# Altium footprint library 16-PCBa Modl.PcbLib: 81 footprints (part 1 of 6)
Each footprint in its own frame and in the unit in brackets; x right, y up, seen from the top. Pads: shape width x height; smd on the part's side, far side on the other; paste and mask are expansions set on the pad; w line width, h text height; cw(c..) or ccw(c..) is an arc to the next point about the centre after c.
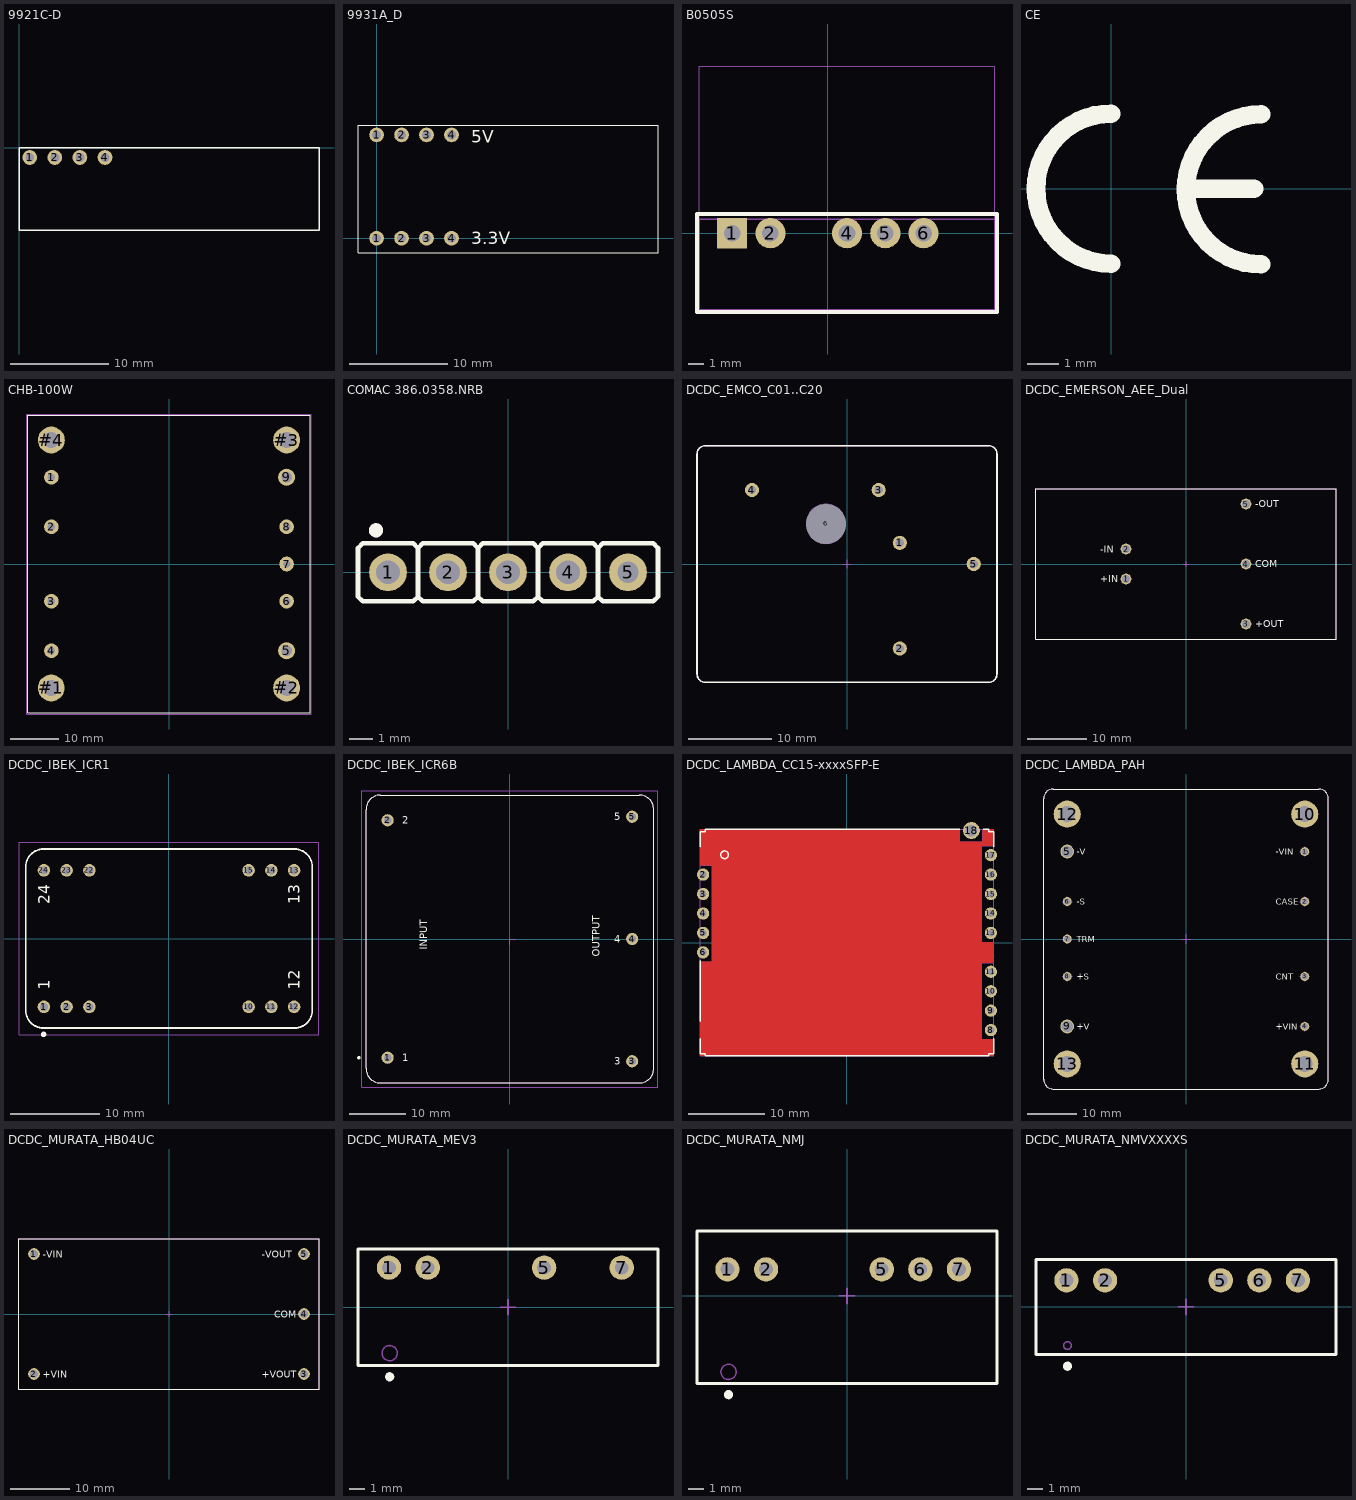
[diagram p0: the footprints below, top view; thin cyan lines are the x and y axes]

## 9921C-D [mm]
height 4.8
pads (4):
  round 1.5 hole 0.9: 1(1.09,-1) 2(3.63,-1) 3(6.17,-1) 4(8.71,-1)
Top Overlay:
  lines w0.127: 0,-8.4 30.4,-8.4 30.4,0 0,0 0,-8.4
3D body "9921C.step": height 6, standoff -2.5, extent 0.127,-8.282 30.226,0.1

## 9931A_D [mm]
height 4.8
pads (8):
  round 1.5 hole 0.9: 1(0,0) 1(0,10.5) 2(2.54,0) 2(2.54,10.5) 3(5.08,0) 3(5.08,10.5) 4(7.62,0) 4(7.62,10.5)
Top Overlay:
  lines w0.127: -1.89,-1.5 28.61,-1.5 28.61,11.5 -1.89,11.5 -1.89,-1.5
  text "3.3V" at 9.61,-0.6 h1.27
  text "5V" at 9.61,9.7 h1.27
3D body "9931A.step": height 6, standoff -3, extent -1.923,-1.6 28.176,11.735

## B0505S [mm]
height 4.8
pads (5):
  rect 2x2 hole 1.1: 1(-6.35,0)
  round 2 hole 1.1 mask+0.07: 2(-3.81,0) 4(1.27,0) 5(3.81,0) 6(6.35,0)
Top Overlay:
  lines w0.254: -8.674,-5.22 11.214,-5.22 11.214,1.27 -8.674,1.27 -8.674,-5.22
Mechanical 15:
  lines w0.05: -8.53,0.92 -8.53,11.08 11.07,11.08 11.07,0.92
  lines w0.1: -8.53,-5.08 11.07,-5.08 11.07,0.92 -8.53,0.92 -8.53,-5.08
3D body "b0505s.stp": height 10.2, standoff -2.49, extent -8.53,-4.859 11.07,1.171

## CE [mm]
Top Overlay:
  lines w0.6: 0,-2.413 cw(c0,0) 0,2.413 ; 2.53,0 4.6,0 ; 4.826,-2.438 cw(c4.826,-0.025) 4.826,2.388
3D body "ce.stp": height 0.02, standoff 0, extent -2.725,-2.725 4.82,2.725

## CHB-100W [mm]
height 4.8
pads (13):
  round 3 hole 1.5: 1(-24.1,17.78) 2(-24.1,7.62) 3(-24.1,-7.62) 4(-24.1,-17.78) 6(24.1,-7.62) 7(24.1,0) 8(24.1,7.62)
  round 3.5 hole 2.2: 5(24.1,-17.78) 9(24.1,17.78)
  round 5.5 hole 3.2: #1(-24.121,-25.4) #2(24.1,-25.4) #3(24.1,25.4) #4(-24.1,25.4)
Top Overlay:
  lines w0.2: -28.95,-30.5 28.95,-30.5 28.95,30.5 -28.95,30.5 -28.95,-30.5
Mechanical 11:
  circle w0.1: c-24.121,-25.4 r1.6
  circle w0.1: c-24.1,25.4 r1.6
  circle w0.1: c24.1,25.4 r1.6
  circle w0.1: c24.1,-25.4 r1.6
  lines w0.254: -29.185,-30.734 29.185,-30.734 29.185,30.734 -29.185,30.734 -29.185,-30.734
3D body "chb100w.stp": height 12.7, standoff -4.6, extent -28.95,-30.5 28.95,30.52
3D body "3-3-1_2-1_8.stp": height 0, standoff -1.8, extent 22.6,6.122 25.6,9.119
3D body "3-3-1_2-1_8.stp": height 0, standoff -1.8, extent 22.6,-1.498 25.6,1.499
3D body "3-3-1_2-1_8.stp": height 0, standoff -1.8, extent 22.6,-9.118 25.6,-6.121
3D body "3-3-1_2-1_8.stp": height 0, standoff -1.8, extent -25.6,-19.278 -22.6,-16.281
3D body "3-3-1_2-1_8.stp": height 0, standoff -1.8, extent -25.6,-9.118 -22.6,-6.121
3D body "3-3-1_2-1_8.stp": height 0, standoff -1.8, extent -25.6,6.122 -22.6,9.119
3D body "3-3-1_2-1_8.stp": height 0, standoff -1.8, extent -25.6,16.282 -22.6,19.279
3D body "3_5-3_5-2-1_8.stp": height 0, standoff -1.8, extent 22.35,-19.528 25.85,-16.032
3D body "3_5-3_5-2-1_8.stp": height 0, standoff -1.8, extent 22.35,16.032 25.85,19.528
3D body "5_5-5_5-3-1_8.stp": height 0, standoff -1.8, extent -26.85,22.653 -21.35,28.147
3D body "5_5-5_5-3-1_8.stp": height 0, standoff -1.8, extent -26.871,-28.147 -21.371,-22.653
3D body "5_5-5_5-3-1_8.stp": height 0, standoff -1.8, extent 21.35,-28.147 26.85,-22.653
3D body "5_5-5_5-3-1_8.stp": height 0, standoff -1.8, extent 21.35,22.653 26.85,28.147

## COMAC 386.0358.NRB [mm]
height 8.3
pads (5):
  round 1.6 hole 1: 1(-5.08,0) 2(-2.54,0) 3(0,0) 4(2.54,0)
  round 1.6 hole 0.9: 5(5.08,0)
Top Overlay:
  circle w0.3: c-5.588,1.778 r0.15
  lines w0.2: -3.81,-1.025 -3.61,-1.225 -1.47,-1.225 -1.27,-1.025 ; -3.81,-1.025 -3.81,1.025 ; -3.81,-1.025 -4.01,-1.225 -6.15,-1.225 -6.35,-1.025 -6.35,1.025 -6.15,1.225 -4.01,1.225 -3.81,1.025 ; -3.81,1.025 -3.61,1.225 -1.47,1.225 -1.27,1.025 ; -1.27,-1.025 -1.07,-1.225 1.07,-1.225 1.27,-1.025 ; -1.27,-1.025 -1.27,1.025 ; -1.27,1.025 -1.07,1.225 1.07,1.225 1.27,1.025 ; 1.27,-1.025 1.47,-1.225 3.61,-1.225 3.81,-1.025 ; 1.27,-1.025 1.27,1.025 ; 1.27,1.025 1.47,1.225 3.61,1.225 3.81,1.025 ; 3.81,-1.025 3.81,1.025 ; 3.81,-1.025 4.01,-1.225 6.15,-1.225 6.35,-1.025 6.35,1.025 6.15,1.225 4.01,1.225 3.81,1.025
Mechanical 14:
  circle w0.3: c-5.588,1.778 r0.15
  lines w0.1: -3.81,-1.025 -3.61,-1.225 -1.47,-1.225 -1.27,-1.025 ; -3.81,-1.025 -3.81,1.025 ; -3.81,-1.025 -4.01,-1.225 -6.15,-1.225 -6.35,-1.025 -6.35,1.025 -6.15,1.225 -4.01,1.225 -3.81,1.025 ; -3.81,1.025 -3.61,1.225 -1.47,1.225 -1.27,1.025 ; -1.27,-1.025 -1.07,-1.225 1.07,-1.225 1.27,-1.025 ; -1.27,-1.025 -1.27,1.025 ; -1.27,1.025 -1.07,1.225 1.07,1.225 1.27,1.025 ; 1.27,-1.025 1.27,1.025 ; 1.27,-1.025 1.47,-1.225 3.61,-1.225 3.81,-1.025 ; 1.27,1.025 1.47,1.225 3.61,1.225 3.81,1.025 ; 3.81,-1.025 3.81,1.025 ; 3.81,-1.025 4.01,-1.225 6.15,-1.225 6.35,-1.025 6.35,1.025 6.15,1.225 4.01,1.225 3.81,1.025
3D body "SAS-Test-301B.step": height 20.05, standoff -2.13, extent -12.677,-0.381 12.423,6.889

## DCDC_EMCO_C01..C20 [mm] "C Series , Body 35.56 x 27.94mm, High Voltage DC-DC Converter"
height 13.21
pads (6):
  round 1.7 hole 1: 1(6.35,2.54) 2(6.35,-10.16) 3(3.81,8.89) 4(-11.43,8.89) 5(15.24,0)
  round 1 hole 4.8 unplated mask+1.9: 6(-2.54,4.83)
Top Overlay:
  lines w0.2: -18.035,-13.225 ccw(c-17.035,-13.225) -17.035,-14.225 17.035,-14.225 ccw(c17.035,-13.225) 18.035,-13.225 18.035,13.225 ccw(c17.035,13.225) 17.035,14.225 -17.035,14.225 ccw(c-17.035,13.225) -18.035,13.225 -18.035,-13.225
Mechanical 8:
  circle w0.1: c-2.54,4.83 r2.375
  lines w0.1: -11.93,8.89 -11.43,8.89 ; -11.43,8.39 -11.43,8.89 ; -11.43,9.39 -11.43,8.89 ; -10.93,8.89 -11.43,8.89 ; -3.04,4.83 -2.54,4.83 ; -2.54,4.33 -2.54,4.83 ; -2.54,5.33 -2.54,4.83 ; -2.04,4.83 -2.54,4.83 ; -0.5,0 0,0 ; 0,-0.5 0,0 ; 0,0.5 0,0 ; 0.5,0 0,0 ; 3.31,8.89 3.81,8.89 ; 3.81,8.39 3.81,8.89 ; 3.81,9.39 3.81,8.89 ; 4.31,8.89 3.81,8.89 ; 5.85,-10.16 6.35,-10.16 ; 5.85,2.54 6.35,2.54 ; 6.35,-10.66 6.35,-10.16 ; 6.35,-9.66 6.35,-10.16 ; 6.35,2.04 6.35,2.54 ; 6.35,3.04 6.35,2.54 ; 6.85,-10.16 6.35,-10.16 ; 6.85,2.54 6.35,2.54 ; 14.74,0 15.24,0 ; 15.24,-0.5 15.24,0 ; 15.24,0.5 15.24,0 ; 15.74,0 15.24,0
Mechanical 14:
  lines w0.1: -18.035,-13.225 ccw(c-17.035,-13.225) -17.035,-14.225 17.035,-14.225 ccw(c17.035,-13.225) 18.035,-13.225 18.035,13.225 ccw(c17.035,13.225) 17.035,14.225 -17.035,14.225 ccw(c-17.035,13.225) -18.035,13.225 -18.035,-13.225
3D body "DCDC_EMCO_C.stp": height 13.21, standoff -3.8, extent -18.035,-14.225 18.035,14.225

## DCDC_EMERSON_AEE_Dual [mm] "AEE 15W Series , Dual Output DCDC Converter, Body 50.8x25.4mm, Height 11.3mm"
height 11.3
pads (5):
  round 1.8 hole 1.3: 1(-10.16,-2.54) 2(-10.16,2.54) 3(10.16,-10.16) 4(10.16,0) 5(10.16,10.16)
Top Overlay:
  lines w0.2: -25.4,-12.7 25.4,-12.7 25.4,12.7 -25.4,12.7 -25.4,-12.7
  text "COM" at 11.71,-0.515 h1.2
  text "+IN" at -14.55,-3.1 h1.2
  text "+OUT" at 11.71,-10.675 h1.2
  text "-OUT" at 11.71,9.645 h1.2
  text "-IN" at -14.55,1.9 h1.2
Mechanical 8:
  lines w0.1: -10.66,-2.54 -10.16,-2.54 ; -10.66,2.54 -10.16,2.54 ; -10.16,-3.04 -10.16,-2.54 ; -10.16,-2.04 -10.16,-2.54 ; -10.16,2.04 -10.16,2.54 ; -10.16,3.04 -10.16,2.54 ; -9.66,-2.54 -10.16,-2.54 ; -9.66,2.54 -10.16,2.54 ; -0.5,0 0,0 ; 0,-0.5 0,0 ; 0,0.5 0,0 ; 0.5,0 0,0 ; 9.66,-10.16 10.16,-10.16 ; 9.66,0 10.16,0 ; 9.66,10.16 10.16,10.16 ; 10.16,-10.66 10.16,-10.16 ; 10.16,-9.66 10.16,-10.16 ; 10.16,-0.5 10.16,0 ; 10.16,0.5 10.16,0 ; 10.16,9.66 10.16,10.16 ; 10.16,10.66 10.16,10.16 ; 10.66,-10.16 10.16,-10.16 ; 10.66,0 10.16,0 ; 10.66,10.16 10.16,10.16
Mechanical 14:
  lines w0.1: -25.4,-12.7 25.4,-12.7 25.4,12.7 -25.4,12.7 -25.4,-12.7
  text "COM" at 11.71,-0.515 h1.2
  text "-IN" at -14.55,1.9 h1.2
  text "+IN" at -14.55,-3.1 h1.2
  text "-OUT" at 11.71,9.645 h1.2
  text "+OUT" at 11.71,-10.675 h1.2
3D body "DCDC_EMERSON_AEE_Dual.stp": height 11.3, standoff -3.8, extent -25.4,-12.7 25.4,12.7

## DCDC_IBEK_ICR1 [mm] "ICR1 Series , Body 32x20mm, Pitch 2.54mm"
height 10.5
pads (12):
  round 1.4 hole 0.9: 1(-13.97,-7.62) 2(-11.43,-7.62) 3(-8.89,-7.62) 10(8.89,-7.62) 11(11.43,-7.62) 12(13.97,-7.62) 13(13.97,7.62) 14(11.43,7.62) 15(8.89,7.62) 22(-8.89,7.62) 23(-11.43,7.62) 24(-13.97,7.62)
Top Overlay:
  circle w0.3: c-14,-10.7 r0.15
  lines w0.2: -16,-8 ccw(c-14,-8) -14,-10 14,-10 ccw(c14,-8) 16,-8 16,8 ccw(c14,8) 14,10 -14,10 ccw(c-14,8) -16,8 -16,-8
  text "12" at 14.605,-5.715 h1.27
  text "24" at -13.335,3.81 h1.27
  text "13" at 14.605,3.81 h1.27
  text "1" at -13.335,-5.715 h1.27
Mechanical 14:
  lines w0.1: -16,-8 ccw(c-14,-8) -14,-10 14,-10 ccw(c14,-8) 16,-8 16,8 ccw(c14,8) 14,10 -14,10 ccw(c-14,8) -16,8 -16,-8
  text "24" at -13.335,3.81 h1.27
  text "13" at 14.605,3.81 h1.27
  text "12" at 14.605,-5.715 h1.27
  text "1" at -13.335,-5.715 h1.27
Mechanical 15:
  lines w0.05: -16.75,-10.75 -16.75,10.75 16.75,10.75 16.75,-10.75 -16.75,-10.75
3D body "DCDC_IBEK_ICR1.stp": height 10.5, standoff -3, extent -16,-10 16,10

## DCDC_IBEK_ICR6B [mm] "ICR6 Series , Body 50.8x50.8mm"
height 10.5
pads (5):
  round 2.15 hole 1.3: 1(-21.59,-20.955) 2(-21.59,20.955) 3(21.59,-21.59) 4(21.59,0) 5(21.59,21.59)
Top Overlay:
  circle w0.3: c-26.67,-20.955 r0.15
  lines w0.2: -25.4,-22.86 ccw(c-22.86,-22.86) -22.86,-25.4 22.86,-25.4 ccw(c22.86,-22.86) 25.4,-22.86 25.4,22.86 ccw(c22.86,22.86) 22.86,25.4 -22.86,25.4 ccw(c-22.86,22.86) -25.4,22.86 -25.4,-22.86
  text "3" at 18.415,-22.225 h1.27
  text "4" at 18.415,-0.635 h1.27
  text "5" at 18.415,20.955 h1.27
  text "2" at -19.05,20.32 h1.27
  text "1" at -19.05,-21.59 h1.27
  text "INPUT" at -14.605,-1.905 h1.27
  text "OUTPUT" at 15.875,-3.175 h1.27
Mechanical 8:
  circle w0.1: c-21.59,-20.955 r0.5
  circle w0.1: c21.59,-21.59 r0.5
  circle w0.1: c21.59,0 r0.5
  circle w0.1: c21.59,21.59 r0.5
  circle w0.1: c-21.59,20.955 r0.5
  lines w0.2: -21.59,-21.955 -21.59,-20.955 -20.59,-20.955 ; -21.59,19.955 -21.59,20.955 -20.59,20.955 ; 0,-1 0,0 1,0 ; 21.59,-22.59 21.59,-21.59 22.59,-21.59 ; 21.59,-1 21.59,0 22.59,0 ; 21.59,20.59 21.59,21.59 22.59,21.59
Mechanical 14:
  lines w0.1: -25.4,-22.86 ccw(c-22.86,-22.86) -22.86,-25.4 22.86,-25.4 ccw(c22.86,-22.86) 25.4,-22.86 25.4,22.86 ccw(c22.86,22.86) 22.86,25.4 -22.86,25.4 ccw(c-22.86,22.86) -25.4,22.86 -25.4,-22.86
  text "3" at 18.415,-22.225 h1.27
  text "4" at 18.415,-0.635 h1.27
  text "5" at 18.415,20.955 h1.27
  text "2" at -19.05,20.32 h1.27
  text "1" at -19.05,-21.59 h1.27
  text "INPUT" at -14.605,-1.905 h1.27
  text "OUTPUT" at 15.875,-3.175 h1.27
Mechanical 15:
  lines w0.05: -26.15,-26.15 -26.15,26.15 26.15,26.15 26.15,-26.15 -26.15,-26.15
3D body "DCDC_IBEK_ICR6B.stp": height 10.5, standoff -3, extent -25.4,-25.4 25.4,25.4

## DCDC_LAMBDA_CC15-xxxxSFP-E [mm] "CCP-E Series, Body L 38.4mm x W 29.6mm x H 6.8mm"
height 6.8
pads (15):
  round 1.6 hole 0.9: 2(-18.8,8.89) 3(-18.8,6.35) 4(-18.8,3.81) 5(-18.8,1.27) 6(-18.8,-1.27) 8(18.8,-11.43) 9(18.8,-8.89) 10(18.8,-6.35) 11(18.8,-3.81) 13(18.8,1.27) 14(18.8,3.81) 15(18.8,6.35) 16(18.8,8.89) 17(18.8,11.43)
  round 2.2 hole 1.5: 18(16.26,14.65)
Top Layer:
  region: -19.2,-2.47 -17.6,-2.47 -17.6,10.09 -19.2,10.09 -19.2,14.8 14.76,14.8 14.76,13.15 17.76,13.15 17.76,14.8 19.2,14.8 19.2,12.63 17.6,12.63 17.6,0.07 19.2,0.07 19.2,-2.61 17.6,-2.61 17.6,-12.63 19.2,-12.63 19.2,-14.8 -19.2,-14.8
Top Overlay:
  circle w0.2: c-16,11.48 r0.5
  lines w0.2: -19.2,-12.561 -19.2,-14.5 -18.5,-14.5 -18.5,-14.8 18.5,-14.8 18.5,-14.5 19.2,-14.5 19.2,-12.561 ; -19.2,-10.299 -19.2,-2.401 ; -19.2,12.561 -19.2,14.5 -18.5,14.5 -18.5,14.8 14.732,14.8 ; 17.78,14.8 18.5,14.8 18.5,14.5 19.2,14.5 19.2,12.561
Mechanical 8:
  lines w0.1: -19.3,-1.27 -18.8,-1.27 ; -19.3,1.27 -18.8,1.27 ; -19.3,3.81 -18.8,3.81 ; -19.3,6.35 -18.8,6.35 ; -19.3,8.89 -18.8,8.89 ; -19.154,-11.784 -18.8,-11.43 ; -19.154,-11.076 -18.8,-11.43 ; -19.154,11.076 -18.8,11.43 ; -19.154,11.784 -18.8,11.43 ; -18.8,-1.77 -18.8,-1.27 ; -18.8,-0.77 -18.8,-1.27 ; -18.8,0.77 -18.8,1.27 ; -18.8,1.77 -18.8,1.27 ; -18.8,3.31 -18.8,3.81 ; -18.8,4.31 -18.8,3.81 ; -18.8,5.85 -18.8,6.35 ; -18.8,6.85 -18.8,6.35 ; -18.8,8.39 -18.8,8.89 ; -18.8,9.39 -18.8,8.89 ; -18.446,-11.784 -18.8,-11.43 ; -18.446,-11.076 -18.8,-11.43 ; -18.446,11.076 -18.8,11.43 ; -18.446,11.784 -18.8,11.43 ; -18.3,-1.27 -18.8,-1.27 ; -18.3,1.27 -18.8,1.27 ; -18.3,3.81 -18.8,3.81 ; -18.3,6.35 -18.8,6.35 ; -18.3,8.89 -18.8,8.89 ; -0.5,0 0,0 ; 0,-0.5 0,0 ; 0,0.5 0,0 ; 0.5,0 0,0 ; 15.76,14.65 16.26,14.65 ; 16.26,14.15 16.26,14.65 ; 16.26,15.15 16.26,14.65 ; 16.76,14.65 16.26,14.65 ; 18.3,-11.43 18.8,-11.43 ; 18.3,-8.89 18.8,-8.89 ; 18.3,-6.35 18.8,-6.35 ; 18.3,-3.81 18.8,-3.81 ; 18.3,1.27 18.8,1.27 ; 18.3,3.81 18.8,3.81 ; 18.3,6.35 18.8,6.35 ; 18.3,8.89 18.8,8.89 ; 18.3,11.43 18.8,11.43 ; 18.446,-1.624 18.8,-1.27 ; 18.446,-0.916 18.8,-1.27 ; 18.8,-11.93 18.8,-11.43 ; 18.8,-10.93 18.8,-11.43 ; 18.8,-9.39 18.8,-8.89 ; 18.8,-8.39 18.8,-8.89 ; 18.8,-6.85 18.8,-6.35 ; 18.8,-5.85 18.8,-6.35 ; 18.8,-4.31 18.8,-3.81 ; 18.8,-3.31 18.8,-3.81 ; 18.8,0.77 18.8,1.27 ; 18.8,1.77 18.8,1.27 ; 18.8,3.31 18.8,3.81 ; 18.8,4.31 18.8,3.81 ; 18.8,5.85 18.8,6.35 ; 18.8,6.85 18.8,6.35 ; 18.8,8.39 18.8,8.89 ; 18.8,9.39 18.8,8.89 ; 18.8,10.93 18.8,11.43 ; 18.8,11.93 18.8,11.43 ; 19.154,-1.624 18.8,-1.27 ; 19.154,-0.916 18.8,-1.27 ; 19.3,-11.43 18.8,-11.43 ; 19.3,-8.89 18.8,-8.89 ; 19.3,-6.35 18.8,-6.35 ; 19.3,-3.81 18.8,-3.81 ; 19.3,1.27 18.8,1.27 ; 19.3,3.81 18.8,3.81 ; 19.3,6.35 18.8,6.35 ; 19.3,8.89 18.8,8.89 ; 19.3,11.43 18.8,11.43 ; -19.2,-14.8 19.2,-14.8 19.2,-12.63 17.6,-12.63 17.6,-2.61 19.2,-2.61 19.2,0.07 17.6,0.07 17.6,12.63 19.2,12.63 19.2,14.8 17.76,14.8 17.76,13.15 14.76,13.15 14.76,14.8 -19.2,14.8 -19.2,10.09 -17.6,10.09 -17.6,-2.47 -19.2,-2.47 -19.2,-14.8
Mechanical 14:
  circle w0.1: c-16,11.48 r0.5
  lines w0.1: -19.2,-14.5 -19.2,14.5 -18.5,14.5 -18.5,14.8 18.5,14.8 18.5,14.5 19.2,14.5 19.2,-14.5 18.5,-14.5 18.5,-14.8 -18.5,-14.8 -18.5,-14.5 -19.2,-14.5
3D body "DC-DC_LAMBDA_CC15-xxxxSFP-E.stp": height 6.3, standoff -2.5, extent -19.2,-14.8 19.2,14.8

## DCDC_LAMBDA_PAH [mm] "PAH Series , Body 57.9x61mm"
height 12.95
pads (13):
  round 1.8 hole 1.3: 1(24.15,17.78) 2(24.15,7.62) 3(24.15,-7.62) 4(24.15,-17.78) 6(-24.15,7.62) 7(-24.15,0) 8(-24.15,-7.62)
  round 2.8 hole 2.3: 5(-24.15,17.78) 9(-24.15,-17.78)
  round 5.5 hole 3.2: 10(24.15,25.4) 11(24.15,-25.4) 12(-24.15,25.4) 13(-24.15,-25.4)
Top Overlay:
  lines w0.2: -28.95,-28.5 ccw(c-26.95,-28.5) -26.95,-30.5 26.95,-30.5 ccw(c26.95,-28.5) 28.95,-28.5 28.95,28.5 ccw(c26.95,28.5) 26.95,30.5 -26.95,30.5 ccw(c-26.95,28.5) -28.95,28.5 -28.95,-28.5
  text "TRM" at -22.175,-0.695 h1.27
  text "-VIN" at 18.265,17.125 h1.27
  text "-S" at -22.175,6.925 h1.27
  text "+S" at -22.175,-8.315 h1.27
  text "+V" at -22.175,-18.475 h1.27
  text "-V" at -22.175,17.085 h1.27
  text "CASE" at 18.265,6.965 h1.27
  text "CNT" at 18.265,-8.275 h1.27
  text "+VIN" at 18.265,-18.435 h1.27
Mechanical 8:
  lines w0.1: -25.15,-25.4 -24.15,-25.4 ; -25.15,-17.78 -24.15,-17.78 ; -25.15,-7.62 -24.15,-7.62 ; -25.15,0 -24.15,0 ; -25.15,7.62 -24.15,7.62 ; -25.15,17.78 -24.15,17.78 ; -25.15,25.4 -24.15,25.4 ; -24.15,-26.4 -24.15,-25.4 ; -24.15,-24.4 -24.15,-25.4 ; -24.15,-18.78 -24.15,-17.78 ; -24.15,-16.78 -24.15,-17.78 ; -24.15,-8.62 -24.15,-7.62 ; -24.15,-6.62 -24.15,-7.62 ; -24.15,-1 -24.15,0 ; -24.15,1 -24.15,0 ; -24.15,6.62 -24.15,7.62 ; -24.15,8.62 -24.15,7.62 ; -24.15,16.78 -24.15,17.78 ; -24.15,18.78 -24.15,17.78 ; -24.15,24.4 -24.15,25.4 ; -24.15,26.4 -24.15,25.4 ; -23.15,-25.4 -24.15,-25.4 ; -23.15,-17.78 -24.15,-17.78 ; -23.15,-7.62 -24.15,-7.62 ; -23.15,0 -24.15,0 ; -23.15,7.62 -24.15,7.62 ; -23.15,17.78 -24.15,17.78 ; -23.15,25.4 -24.15,25.4 ; -1,0 0,0 ; 0,-1 0,0 ; 0,1 0,0 ; 1,0 0,0 ; 23.15,-25.4 24.15,-25.4 ; 23.15,-17.78 24.15,-17.78 ; 23.15,-7.62 24.15,-7.62 ; 23.15,7.62 24.15,7.62 ; 23.15,17.78 24.15,17.78 ; 23.15,25.4 24.15,25.4 ; 24.15,-26.4 24.15,-25.4 ; 24.15,-24.4 24.15,-25.4 ; 24.15,-18.78 24.15,-17.78 ; 24.15,-16.78 24.15,-17.78 ; 24.15,-8.62 24.15,-7.62 ; 24.15,-6.62 24.15,-7.62 ; 24.15,6.62 24.15,7.62 ; 24.15,8.62 24.15,7.62 ; 24.15,16.78 24.15,17.78 ; 24.15,18.78 24.15,17.78 ; 24.15,24.4 24.15,25.4 ; 24.15,26.4 24.15,25.4 ; 25.15,-25.4 24.15,-25.4 ; 25.15,-17.78 24.15,-17.78 ; 25.15,-7.62 24.15,-7.62 ; 25.15,7.62 24.15,7.62 ; 25.15,17.78 24.15,17.78 ; 25.15,25.4 24.15,25.4
Mechanical 14:
  lines w0.1: -28.95,-28.5 ccw(c-26.95,-28.5) -26.95,-30.5 26.95,-30.5 ccw(c26.95,-28.5) 28.95,-28.5 28.95,28.5 ccw(c26.95,28.5) 26.95,30.5 -26.95,30.5 ccw(c-26.95,28.5) -28.95,28.5 -28.95,-28.5
  text "TRM" at -22.175,-0.695 h1.27
  text "-VIN" at 18.265,17.125 h1.27
  text "-S" at -22.175,6.925 h1.27
  text "+S" at -22.175,-8.315 h1.27
  text "+V" at -22.175,-18.475 h1.27
  text "-V" at -22.175,17.085 h1.27
  text "CASE" at 18.265,6.965 h1.27
  text "CNT" at 18.265,-8.275 h1.27
  text "+VIN" at 18.265,-18.435 h1.27
3D body "DC-DC_LAMBDA_PAH.stp": height 12.95, standoff -3.8, extent -28.95,-30.5 28.95,30.5

## DCDC_MURATA_HB04UC [mm] "HB04UC Series , Body 50.8x25.4mm, Height 10.4mm"
height 10.41
pads (5):
  round 2 hole 1.3: 1(-22.86,10.16) 2(-22.86,-10.16) 3(22.86,-10.16) 4(22.86,0) 5(22.86,10.16)
Top Overlay:
  lines w0.2: -25.4,-12.7 -25.4,12.7 25.4,12.7 25.4,-12.7 -25.4,-12.7
  text "-VOUT" at 15.725,9.505 h1.2
  text "COM" at 17.825,-0.605 h1.2
  text "-VIN" at -21.385,9.555 h1.2
  text "+VOUT" at 15.725,-10.815 h1.2
  text "+VIN" at -21.385,-10.765 h1.2
Mechanical 8:
  lines w0.1: -23.36,-10.16 -22.86,-10.16 ; -23.36,10.16 -22.86,10.16 ; -22.86,-10.66 -22.86,-10.16 ; -22.86,-9.66 -22.86,-10.16 ; -22.86,9.66 -22.86,10.16 ; -22.86,10.66 -22.86,10.16 ; -22.36,-10.16 -22.86,-10.16 ; -22.36,10.16 -22.86,10.16 ; -0.5,0 0,0 ; 0,-0.5 0,0 ; 0,0.5 0,0 ; 0.5,0 0,0 ; 22.36,-10.16 22.86,-10.16 ; 22.36,0 22.86,0 ; 22.36,10.16 22.86,10.16 ; 22.86,-10.66 22.86,-10.16 ; 22.86,-9.66 22.86,-10.16 ; 22.86,-0.5 22.86,0 ; 22.86,0.5 22.86,0 ; 22.86,9.66 22.86,10.16 ; 22.86,10.66 22.86,10.16 ; 23.36,-10.16 22.86,-10.16 ; 23.36,0 22.86,0 ; 23.36,10.16 22.86,10.16
Mechanical 14:
  lines w0.1: -25.4,-12.7 -25.4,12.7 25.4,12.7 25.4,-12.7 -25.4,-12.7
  text "-VOUT" at 15.725,9.505 h1.2
  text "COM" at 17.825,-0.605 h1.2
  text "-VIN" at -21.385,9.555 h1.2
  text "+VOUT" at 15.725,-10.815 h1.2
  text "+VIN" at -21.385,-10.765 h1.2
3D body "DCDC_MURATA_HB04UC.stp": height 10.46, standoff -3.8, extent -25.4,-12.7 25.4,12.7

## DCDC_MURATA_MEV3 [mm] "MEV3S Series , Body 19.65 x 7.65mm, SIP-7"
height 10.15
pads (4):
  round 1.6 hole 0.9: 1(-7.795,2.6) 2(-5.255,2.6) 5(2.365,2.6) 7(7.445,2.6)
Top Overlay:
  circle w0.3: c-7.75,-4.55 r0.15
  lines w0.2: -9.825,-3.825 9.825,-3.825 9.825,3.825 -9.825,3.825 -9.825,-3.825
Mechanical 8:
  lines w0.1: -8.295,2.6 -7.795,2.6 ; -7.795,2.1 -7.795,2.6 ; -7.795,3.1 -7.795,2.6 ; -7.295,2.6 -7.795,2.6 ; -5.755,2.6 -5.255,2.6 ; -5.255,2.1 -5.255,2.6 ; -5.255,3.1 -5.255,2.6 ; -4.755,2.6 -5.255,2.6 ; -0.5,0 0,0 ; 0,-0.5 0,0 ; 0,0.5 0,0 ; 0.5,0 0,0 ; 1.865,2.6 2.365,2.6 ; 2.365,2.1 2.365,2.6 ; 2.365,3.1 2.365,2.6 ; 2.865,2.6 2.365,2.6 ; 6.945,2.6 7.445,2.6 ; 7.445,2.1 7.445,2.6 ; 7.445,3.1 7.445,2.6 ; 7.945,2.6 7.445,2.6
Mechanical 14:
  circle w0.1: c-7.75,-3 r0.5
  lines w0.1: -9.825,-3.825 9.825,-3.825 9.825,3.825 -9.825,3.825 -9.825,-3.825
3D body "DCDC_MURATA_MEV3.stp": height 10.15, standoff -3.6, extent -9.825,-3.825 9.825,3.825

## DCDC_MURATA_NMJ [mm] "NMJ Series , Body 19.5 x 9.8mm, SIP-7"
height 12.5
pads (5):
  round 1.6 hole 0.9: 1(-7.87,1.75) 2(-5.33,1.75) 5(2.29,1.75) 6(4.83,1.75) 7(7.37,1.75)
Top Overlay:
  circle w0.3: c-7.8,-6.5 r0.15
  lines w0.2: -9.875,-5.775 9.875,-5.775 9.875,4.275 -9.875,4.275 -9.875,-5.775
Mechanical 8:
  lines w0.1: -8.37,1.75 -7.87,1.75 ; -7.87,1.25 -7.87,1.75 ; -7.87,2.25 -7.87,1.75 ; -7.37,1.75 -7.87,1.75 ; -5.83,1.75 -5.33,1.75 ; -5.33,1.25 -5.33,1.75 ; -5.33,2.25 -5.33,1.75 ; -4.83,1.75 -5.33,1.75 ; -0.5,0 0,0 ; 0,-0.5 0,0 ; 0,0.5 0,0 ; 0.5,0 0,0 ; 1.79,1.75 2.29,1.75 ; 2.29,1.25 2.29,1.75 ; 2.29,2.25 2.29,1.75 ; 2.79,1.75 2.29,1.75 ; 4.33,1.75 4.83,1.75 ; 4.83,1.25 4.83,1.75 ; 4.83,2.25 4.83,1.75 ; 5.33,1.75 4.83,1.75 ; 6.87,1.75 7.37,1.75 ; 7.37,1.25 7.37,1.75 ; 7.37,2.25 7.37,1.75 ; 7.87,1.75 7.37,1.75
Mechanical 14:
  circle w0.1: c-7.8,-5 r0.5
  lines w0.1: -9.875,-5.775 9.875,-5.775 9.875,4.275 -9.875,4.275 -9.875,-5.775
3D body "DCDC_MURATA_NMJ.stp": height 12.75, standoff -3.75, extent -9.875,-5.775 9.875,4.275

## DCDC_MURATA_NMVXXXXS [mm] "NMV Series , Body 19.5 x 6mm, SIP-7"
height 10.25
pads (5):
  round 1.6 hole 0.9: 1(-7.87,1.75) 2(-5.33,1.75) 5(2.29,1.75) 6(4.83,1.75) 7(7.37,1.75)
Top Overlay:
  circle w0.3: c-7.8,-3.9 r0.15
  lines w0.2: -9.875,-3.125 9.875,-3.125 9.875,3.125 -9.875,3.125 -9.875,-3.125
Mechanical 8:
  lines w0.1: -8.37,1.75 -7.87,1.75 ; -7.87,1.25 -7.87,1.75 ; -7.87,2.25 -7.87,1.75 ; -7.37,1.75 -7.87,1.75 ; -5.83,1.75 -5.33,1.75 ; -5.33,1.25 -5.33,1.75 ; -5.33,2.25 -5.33,1.75 ; -4.83,1.75 -5.33,1.75 ; -0.5,0 0,0 ; 0,-0.5 0,0 ; 0,0.5 0,0 ; 0.5,0 0,0 ; 1.79,1.75 2.29,1.75 ; 2.29,1.25 2.29,1.75 ; 2.29,2.25 2.29,1.75 ; 2.79,1.75 2.29,1.75 ; 4.33,1.75 4.83,1.75 ; 4.83,1.25 4.83,1.75 ; 4.83,2.25 4.83,1.75 ; 5.33,1.75 4.83,1.75 ; 6.87,1.75 7.37,1.75 ; 7.37,1.25 7.37,1.75 ; 7.37,2.25 7.37,1.75 ; 7.87,1.75 7.37,1.75
Mechanical 14:
  circle w0.1: c-7.8,-2.54 r0.254
  lines w0.1: -9.875,-3.125 -9.875,3.125 9.875,3.125 9.875,-3.125 -9.875,-3.125
3D body "DCDC_MURATA_NMVXXXXS.stp": height 10.25, standoff -3.75, extent -9.875,-3.125 9.875,3.125